# Altium footprint library HeadersPin_1rows_M_180.PcbLib: 40 footprints (part 3 of 3)
Each footprint in its own frame and in the unit in brackets; x right, y up, seen from the top. Pads: shape width x height; smd on the part's side, far side on the other; paste and mask are expansions set on the pad; w line width, h text height; cw(c..) or ccw(c..) is an arc to the next point about the centre after c.
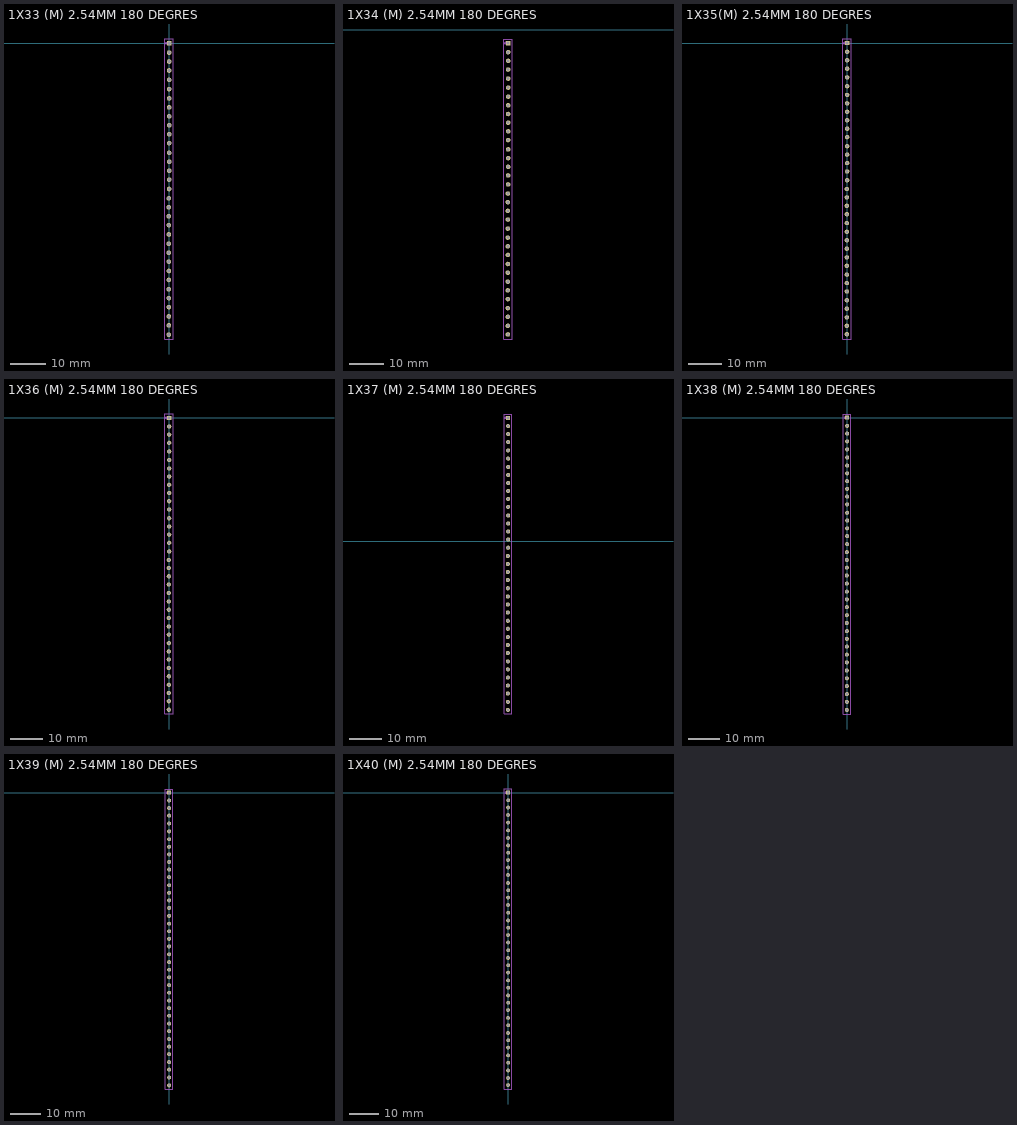
[diagram p2: the footprints below, top view; thin cyan lines are the x and y axes]

## 1X33 (M) 2.54MM 180 DEGRES [mm]
pads (33):
  rect 1.3x1.3 hole 0.9 mask+0.05: 1(0,0)
  round 1.3 hole 0.9 mask+0.05: 2(0,-2.6) 3(0,-5.1) 4(0,-7.6) 5(0,-10.2) 6(0,-12.8) 7(0,-15.4) 8(0,-17.9) 9(0,-20.4) 10(0,-22.9) 11(0,-25.4) 12(0,-27.9) 13(0,-30.6) 14(0,-33.1) 15(0,-35.6) 16(0,-38.1) 17(0,-40.7) 18(-0.1,-43.3) 19(-0.1,-45.8) 20(-0.1,-48.3) 21(-0.1,-50.8) 22(-0.1,-53.4) 23(-0.1,-56) 24(-0.1,-58.5) 25(-0.1,-61) 26(-0.1,-63.6) 27(-0.1,-66.1) 28(-0.1,-68.7) 29(-0.1,-71.2) 30(-0.1,-73.7) 31(-0.1,-76.3) 32(-0.1,-78.8) 33(-0.1,-81.4)
Mechanical 2:
  circle w0.4: c-0.8,0 r0.2
  lines w0.2: -1.3,-82.6 1.2,-82.6 1.2,1.2 -1.3,1.2 -1.3,-82.6
  text ".Designator" at 0.638,-13.246 h1.52
3D body "1x33 Male Pin Header.STEP": height 10.54, standoff -3, extent -1.3,-82.625 1.2,1.2

## 1X34 (M) 2.54MM 180 DEGRES [mm]
pads (34):
  rect 1.3x1.3 hole 0.9 mask+0.05: 1(179.5,-3.8)
  round 1.3 hole 0.9 mask+0.05: 2(179.5,-6.4) 3(179.5,-8.9) 4(179.5,-11.4) 5(179.5,-14) 6(179.5,-16.6) 7(179.5,-19.2) 8(179.5,-21.7) 9(179.5,-24.2) 10(179.5,-26.7) 11(179.5,-29.2) 12(179.5,-31.7) 13(179.5,-34.4) 14(179.5,-36.9) 15(179.5,-39.4) 16(179.5,-41.9) 17(179.5,-44.5) 18(179.4,-47.1) 19(179.4,-49.6) 20(179.4,-52.1) 21(179.4,-54.6) 22(179.4,-57.2) 23(179.4,-59.8) 24(179.4,-62.3) 25(179.4,-64.8) 26(179.4,-67.4) 27(179.4,-69.9) 28(179.4,-72.5) 29(179.4,-75) 30(179.4,-77.5) 31(179.4,-80.1) 32(179.4,-82.6) 33(179.4,-85.2) 34(179.4,-87.7)
Mechanical 2:
  circle w0.4: c178.7,-3.8 r0.2
  lines w0.2: 178.2,-89 180.7,-89 180.7,-2.6 178.2,-2.6 178.2,-89
  text ".Designator" at 180.138,-17.046 h1.52
3D body "1x34 Male Pin Header.STEP": height 10.54, standoff -3, extent 178.2,-88.965 180.7,-2.6

## 1X35(M) 2.54MM 180 DEGRES [mm]
pads (35):
  rect 1.3x1.3 hole 0.9 mask+0.05: 1(0,0)
  round 1.3 hole 0.9 mask+0.05: 2(0,-2.6) 3(0,-5.1) 4(0,-7.6) 5(0,-10.2) 6(0,-12.8) 7(0,-15.4) 8(0,-17.9) 9(0,-20.4) 10(0,-22.9) 11(0,-25.4) 12(0,-27.9) 13(0,-30.6) 14(0,-33.1) 15(0,-35.6) 16(0,-38.1) 17(0,-40.7) 18(-0.1,-43.3) 19(-0.1,-45.8) 20(-0.1,-48.3) 21(-0.1,-50.8) 22(-0.1,-53.4) 23(-0.1,-56) 24(-0.1,-58.5) 25(-0.1,-61) 26(-0.1,-63.6) 27(-0.1,-66.1) 28(-0.1,-68.7) 29(-0.1,-71.2) 30(-0.1,-73.7) 31(-0.1,-76.3) 32(-0.1,-78.8) 33(-0.1,-81.4) 34(-0.1,-83.9) 35(-0.1,-86.4)
Mechanical 2:
  circle w0.4: c-0.8,0 r0.2
  lines w0.2: -1.3,-87.8 -1.3,1.2 1.2,1.2 1.2,-87.8 -1.3,-87.8
  text ".Designator" at 0.638,-13.246 h1.52
3D body "1x35 Male Pin Header.STEP": height 10.54, standoff -3, extent -1.3,-87.705 1.2,1.2

## 1X36 (M) 2.54MM 180 DEGRES [mm]
pads (36):
  rect 1.3x1.3 hole 0.9 mask+0.05: 1(0,0)
  round 1.3 hole 0.9 mask+0.05: 2(0,-2.6) 3(0,-5.1) 4(0,-7.6) 5(0,-10.2) 6(0,-12.8) 7(0,-15.4) 8(0,-17.9) 9(0,-20.4) 10(0,-22.9) 11(0,-25.4) 12(0,-27.9) 13(0,-30.6) 14(0,-33.1) 15(0,-35.6) 16(0,-38.1) 17(0,-40.7) 18(-0.1,-43.3) 19(-0.1,-45.8) 20(-0.1,-48.3) 21(-0.1,-50.8) 22(-0.1,-53.4) 23(-0.1,-56) 24(-0.1,-58.5) 25(-0.1,-61) 26(-0.1,-63.6) 27(-0.1,-66.1) 28(-0.1,-68.7) 29(-0.1,-71.2) 30(-0.1,-73.7) 31(-0.1,-76.3) 32(-0.1,-78.8) 33(-0.1,-81.4) 34(-0.1,-83.9) 35(-0.1,-86.4) 36(-0.1,-89)
Mechanical 2:
  circle w0.4: c-0.8,0 r0.2
  lines w0.2: -1.3,-90.3 1.2,-90.3 1.2,1.2 -1.3,1.2 -1.3,-90.3
  text ".Designator" at 0.638,-13.246 h1.52
3D body "1x36 Male Pin Header.STEP": height 10.54, standoff -3, extent -1.3,-90.245 1.2,1.2

## 1X37 (M) 2.54MM 180 DEGRES [mm]
pads (37):
  rect 1.3x1.3 hole 0.9 mask+0.05: 1(274.9,38.6)
  round 1.3 hole 0.9 mask+0.05: 2(274.9,36) 3(274.9,33.5) 4(274.9,31) 5(274.9,28.4) 6(274.9,25.8) 7(274.9,23.2) 8(274.9,20.7) 9(274.9,18.2) 10(274.9,15.7) 11(274.9,13.2) 12(274.9,10.7) 13(274.9,8) 14(274.9,5.5) 15(274.9,3) 16(274.9,0.5) 17(274.9,-2.1) 18(274.8,-4.7) 19(274.8,-7.2) 20(274.8,-9.7) 21(274.8,-12.2) 22(274.8,-14.8) 23(274.8,-17.4) 24(274.8,-19.9) 25(274.8,-22.4) 26(274.8,-25) 27(274.8,-27.5) 28(274.8,-30.1) 29(274.8,-32.6) 30(274.8,-35.1) 31(274.8,-37.7) 32(274.8,-40.2) 33(274.8,-42.8) 34(274.8,-45.3) 35(274.8,-47.8) 36(274.8,-50.4) 37(274.8,-52.9)
Mechanical 2:
  circle w0.4: c274.1,38.6 r0.2
  lines w0.2: 273.6,-54.2 273.6,39.8 276.1,39.8 276.1,-54.2 273.6,-54.2
  text ".Designator" at 275.538,25.354 h1.52
3D body "1x37 Male Pin Header.STEP": height 10.54, standoff -3, extent 273.6,-54.185 276.1,39.8

## 1X38 (M) 2.54MM 180 DEGRES [mm]
pads (38):
  rect 1.3x1.3 hole 0.9 mask+0.05: 1(0,0)
  round 1.3 hole 0.9 mask+0.05: 2(0,-2.6) 3(0,-5.1) 4(0,-7.6) 5(0,-10.2) 6(0,-12.8) 7(0,-15.4) 8(0,-17.9) 9(0,-20.4) 10(0,-22.9) 11(0,-25.4) 12(0,-27.9) 13(0,-30.6) 14(0,-33.1) 15(0,-35.6) 16(0,-38.1) 17(0,-40.7) 18(-0.1,-43.3) 19(-0.1,-45.8) 20(-0.1,-48.3) 21(-0.1,-50.8) 22(-0.1,-53.4) 23(-0.1,-56) 24(-0.1,-58.5) 25(-0.1,-61) 26(-0.1,-63.6) 27(-0.1,-66.1) 28(-0.1,-68.7) 29(-0.1,-71.2) 30(-0.1,-73.7) 31(-0.1,-76.3) 32(-0.1,-78.8) 33(-0.1,-81.4) 34(-0.1,-83.9) 35(-0.1,-86.4) 36(-0.1,-89) 37(-0.1,-91.5) 38(-0.1,-94.1)
Mechanical 2:
  circle w0.4: c-0.8,0 r0.2
  lines w0.2: -1.3,-95.4 1.2,-95.4 1.2,1.2 -1.3,1.2 -1.3,-95.4
  text ".Designator" at 0.638,-13.246 h1.52
3D body "1x38 Male Pin Header.STEP": height 10.54, standoff -3, extent -1.3,-95.325 1.2,1.2

## 1X39 (M) 2.54MM 180 DEGRES [mm]
pads (39):
  rect 1.3x1.3 hole 0.9 mask+0.05: 1(0,0)
  round 1.3 hole 0.9 mask+0.05: 2(0,-2.6) 3(0,-5.1) 4(0,-7.6) 5(0,-10.2) 6(0,-12.8) 7(0,-15.4) 8(0,-17.9) 9(0,-20.4) 10(0,-22.9) 11(0,-25.4) 12(0,-27.9) 13(0,-30.6) 14(0,-33.1) 15(0,-35.6) 16(0,-38.1) 17(0,-40.7) 18(0,-43.3) 19(0,-45.8) 20(0,-48.3) 21(0,-50.8) 22(0,-53.4) 23(0,-56) 24(0,-58.5) 25(0,-61) 26(0,-63.6) 27(0,-66.1) 28(0,-68.7) 29(0,-71.2) 30(0,-73.7) 31(0,-76.3) 32(0,-78.8) 33(0,-81.4) 34(0,-83.9) 35(0,-86.4) 36(0,-89) 37(0,-91.5) 38(0,-94.1) 39(0,-96.7)
Mechanical 2:
  circle w0.4: c-0.8,0 r0.2
  lines w0.2: -1.3,-97.9 -1.3,1.2 1.2,1.2 1.2,-97.9 -1.3,-97.9
  text ".Designator" at 0.638,-13.246 h1.52
3D body "1x39 Male Pin Header.STEP": height 10.54, standoff -3, extent -1.3,-97.865 1.2,1.2

## 1X40 (M) 2.54MM 180 DEGRES [mm]
pads (40):
  rect 1.3x1.3 hole 0.9 mask+0.05: 1(0,0)
  round 1.3 hole 0.9 mask+0.05: 2(0,-2.6) 3(0,-5.1) 4(0,-7.6) 5(0,-10.2) 6(0,-12.8) 7(0,-15.4) 8(0,-17.9) 9(0,-20.4) 10(0,-22.9) 11(0,-25.4) 12(0,-27.9) 13(0,-30.6) 14(0,-33.1) 15(0,-35.6) 16(0,-38.1) 17(0,-40.7) 18(0,-43.3) 19(0,-45.8) 20(0,-48.3) 21(0,-50.8) 22(0,-53.4) 23(0,-56) 24(0,-58.5) 25(0,-61) 26(0,-63.6) 27(0,-66.1) 28(0,-68.7) 29(0,-71.2) 30(0,-73.7) 31(0,-76.3) 32(0,-78.8) 33(0,-81.4) 34(0,-83.9) 35(0,-86.4) 36(0,-89) 37(0,-91.5) 38(0,-94.1) 39(0,-96.7) 40(0,-99.1)
Mechanical 2:
  circle w0.4: c-0.8,0 r0.2
  lines w0.2: -1.3,-100.4 1.2,-100.4 1.2,1.2 -1.3,1.2 -1.3,-100.4
  text ".Designator" at 0.127,-4.699 h1.52
3D body "1x40 Male Pin Header.STEP": height 10.54, standoff -3, extent -1.25,-100.405 1.25,1.2